# Altium footprint library Nhan_Module.PcbLib: 43 footprints (part 3 of 3)
Each footprint in its own frame and in the unit in brackets; x right, y up, seen from the top. Pads: shape width x height; smd on the part's side, far side on the other; paste and mask are expansions set on the pad; w line width, h text height; cw(c..) or ccw(c..) is an arc to the next point about the centre after c.
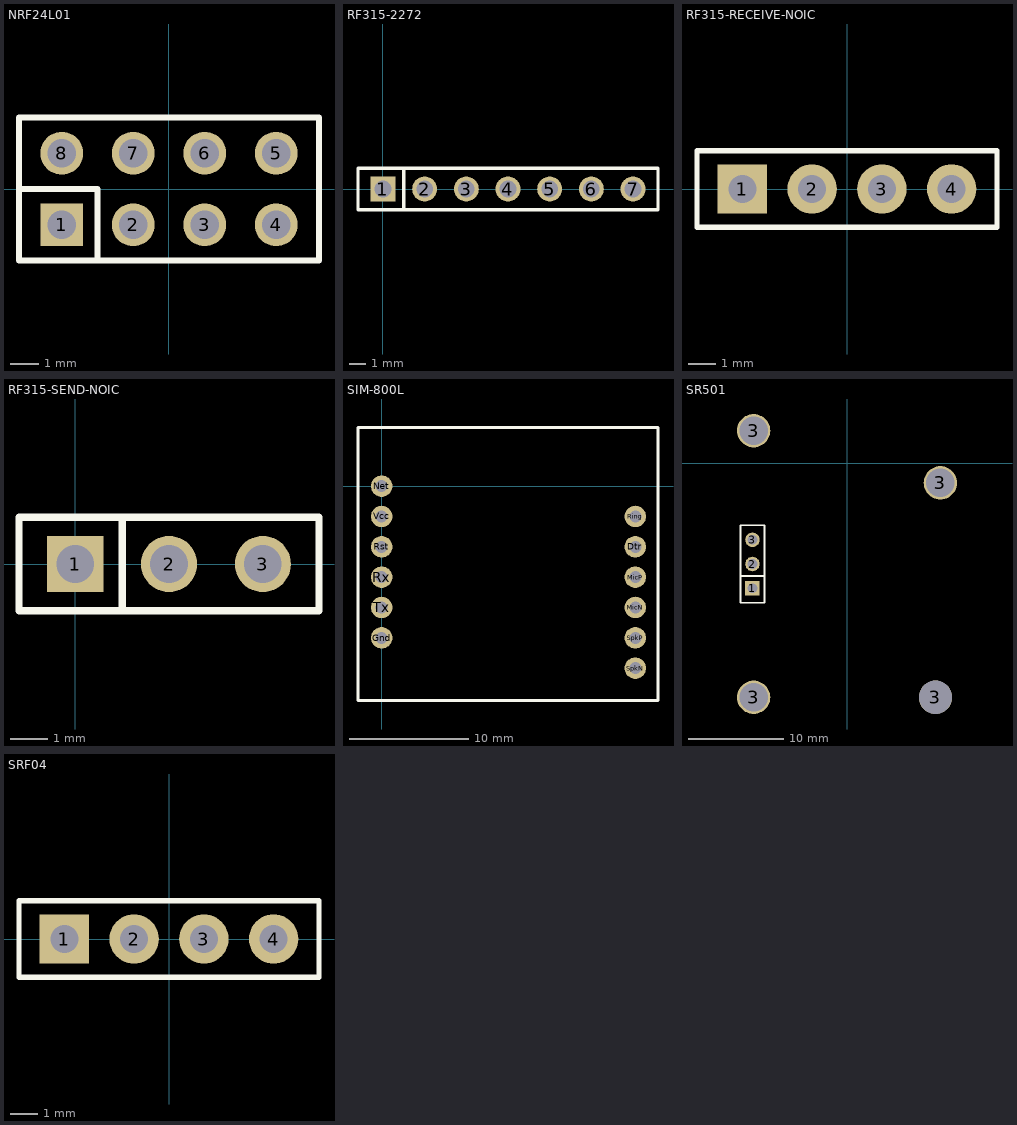
[diagram p2: the footprints below, top view; thin cyan lines are the x and y axes]

## NRF24L01 [mm]
height 8.5
pads (8):
  rect 1.52x1.52 hole 1.02: 1(-3.81,-1.27)
  round 1.52 hole 1.02: 2(-1.27,-1.27) 3(1.27,-1.27) 4(3.81,-1.27) 5(3.81,1.27) 6(1.27,1.27) 7(-1.27,1.27) 8(-3.81,1.27)
Top Overlay:
  lines w0.2: -5.33,0 -2.54,0 -2.54,-2.54 ; -5.33,-2.54 -5.33,2.54 5.33,2.54 5.33,-2.54 -5.33,-2.54
3D body "nRF24L01+_enhanced.SLDPRT": height 15.4, standoff 2.55, extent -5.849,-2.794 9.151,26.206
3D body "61300821821.stp": height 8.51, standoff -3.09, extent -5.33,-2.54 5.33,2.54

## RF315-2272 [mm]
height 8.5
pads (7):
  rect 1.52x1.52 hole 1.02: 1(0,0)
  round 1.52 hole 1.02: 2(2.54,0) 3(5.08,0) 4(7.62,0) 5(10.16,0) 6(12.7,0) 7(15.24,0)
Top Overlay:
  lines w0.2: 1.27,-1.27 1.27,1.27 ; -1.52,-1.27 16.76,-1.27 16.76,1.27 -1.52,1.27 -1.52,-1.27
3D body "User Library-XY_DJM_5V_RECEPTOR.STEP": height 30.31, standoff 2.31, extent -24.363,-1.468 16.637,5.532
3D body "61300711821.stp": height 8.51, standoff -3.09, extent -1.52,-1.25 16.76,1.25

## RF315-RECEIVE-NOIC [mm]
height 8.5
pads (4):
  rect 1.8x1.8 hole 1.02: 1(-3.81,0)
  round 1.8 hole 1.02: 2(-1.27,0) 3(1.27,0) 4(3.81,0)
Top Overlay:
  lines w0.2: -5.461,-1.397 -5.461,1.397 5.461,1.397 5.461,-1.397 -5.461,-1.397
3D body "User Library-XD-RF-5V.STEP": height 21.75, standoff 2.75, extent -22.366,-1.524 7.634,6.476
3D body "61300411821.stp": height 8.51, standoff -3.09, extent -5.33,-1.25 5.33,1.25

## RF315-SEND-NOIC [mm]
height 8.5
pads (3):
  rect 1.52x1.52 hole 1.02: 1(0,0)
  round 1.52 hole 1.02: 2(2.54,0) 3(5.08,0)
Top Overlay:
  lines w0.2: 1.27,-1.27 1.27,1.27 ; -1.524,-1.27 -1.524,1.27 6.6,1.27 6.6,-1.27 -1.524,-1.27
3D body "User Library-XD-FST.STEP": height 27.22, standoff 2.32, extent -7.468,-1.526 11.532,6.604
3D body "61300311821.stp": height 8.51, standoff -3.09, extent -1.52,-1.25 6.6,1.25

## rn4020 [mil]
height 334.65
3D body "RN4020.step": height 0.39, standoff -90.55, extent -365,-232.72 402.92,220.28

## SD-CARD [mil]
3D body "SD Card readerwriter.stp": height 400.32, standoff -39.45, extent -454.85,-2032.27 742,326

## SIM-800L [mm] "Module SIM 800L"
pads (12):
  round 1.8 hole 1: Dtr(21.24,-5.08) Gnd(0,-12.7) MicN(21.24,-10.16) MicP(21.24,-7.62) Net(0,0) Ring(21.24,-2.54) Rst(0,-5.08) Rx(0,-7.62) SpkN(21.24,-15.24) SpkP(21.24,-12.7) Tx(0,-10.16) Vcc(0,-2.54)
Top Overlay:
  lines w0.254: -1.981,-0.127 -1.981,4.902 0.61,4.902 ; -1.981,-0.025 -1.981,-15.011 -1.981,-17.938 21.24,-17.938 23.139,-17.938 23.139,-5.105 ; 0.025,4.902 23.139,4.902 23.139,-5.486
3D body "User Library-SIM800C.STEP": height 2.31, standoff 0, extent 1.487,-16.005 19.087,-0.305

## SR501 [mm]
height 8.5
pads (7):
  rect 1.52x1.52 hole 1.02: 1(-9.906,-13.081)
  round 1.52 hole 1.02: 2(-9.906,-10.541) 3(-9.906,-8.001)
  round 3.5 hole 3: 3(-9.779,-24.511) 3(-9.779,3.429) 3(9.779,-2.032)
  round 3.5 hole 3.5: 3(9.271,-24.511)
Top Overlay:
  lines w0.2: -11.176,-11.811 -8.636,-11.811 ; -11.176,-14.601 -8.636,-14.601 -8.636,-6.481 -11.176,-6.481 -11.176,-14.601
3D body "61300311821.stp": height 8.51, standoff -3.09, extent -11.156,-14.601 -8.656,-6.481
3D body "sensor board.STEP": height 15, standoff 0, extent -12.254,-26.541 12.746,5.459
3D body "lens.SLDPRT": height 23.5, standoff 4, extent -12.189,-22.541 11.811,1.459

## SRF04 [mm]
height 8.5
pads (4):
  rect 1.8x1.8 hole 1.02: 1(-3.81,0)
  round 1.8 hole 1.02: 2(-1.27,0) 3(1.27,0) 4(3.81,0)
Top Overlay:
  lines w0.2: -5.461,-1.397 5.461,-1.397 5.461,1.397 -5.461,1.397 -5.461,-1.397
3D body "61300411821.stp": height 8.51, standoff -3.09, extent -5.33,-1.25 5.33,1.25
3D body "User Library-HC-SR04.STEP": height 28.5, standoff 3.32, extent -22.246,-0.254 22.754,17.814

## tcrt 5000 [mil]
height 334.65
3D body "User Library-TCRT-5000.STEP": height 255.91, standoff -1000.44, extent -196.33,-119.17 209.18,109.18

## TEMP [mil]